# Altium footprint library SparkFun-Connectors.PCBLIB: 409 footprints (part 25 of 26)
Each footprint in its own frame and in the unit in brackets; x right, y up, seen from the top. Pads: shape width x height; smd on the part's side, far side on the other; paste and mask are expansions set on the pad; w line width, h text height; cw(c..) or ccw(c..) is an arc to the next point about the centre after c.
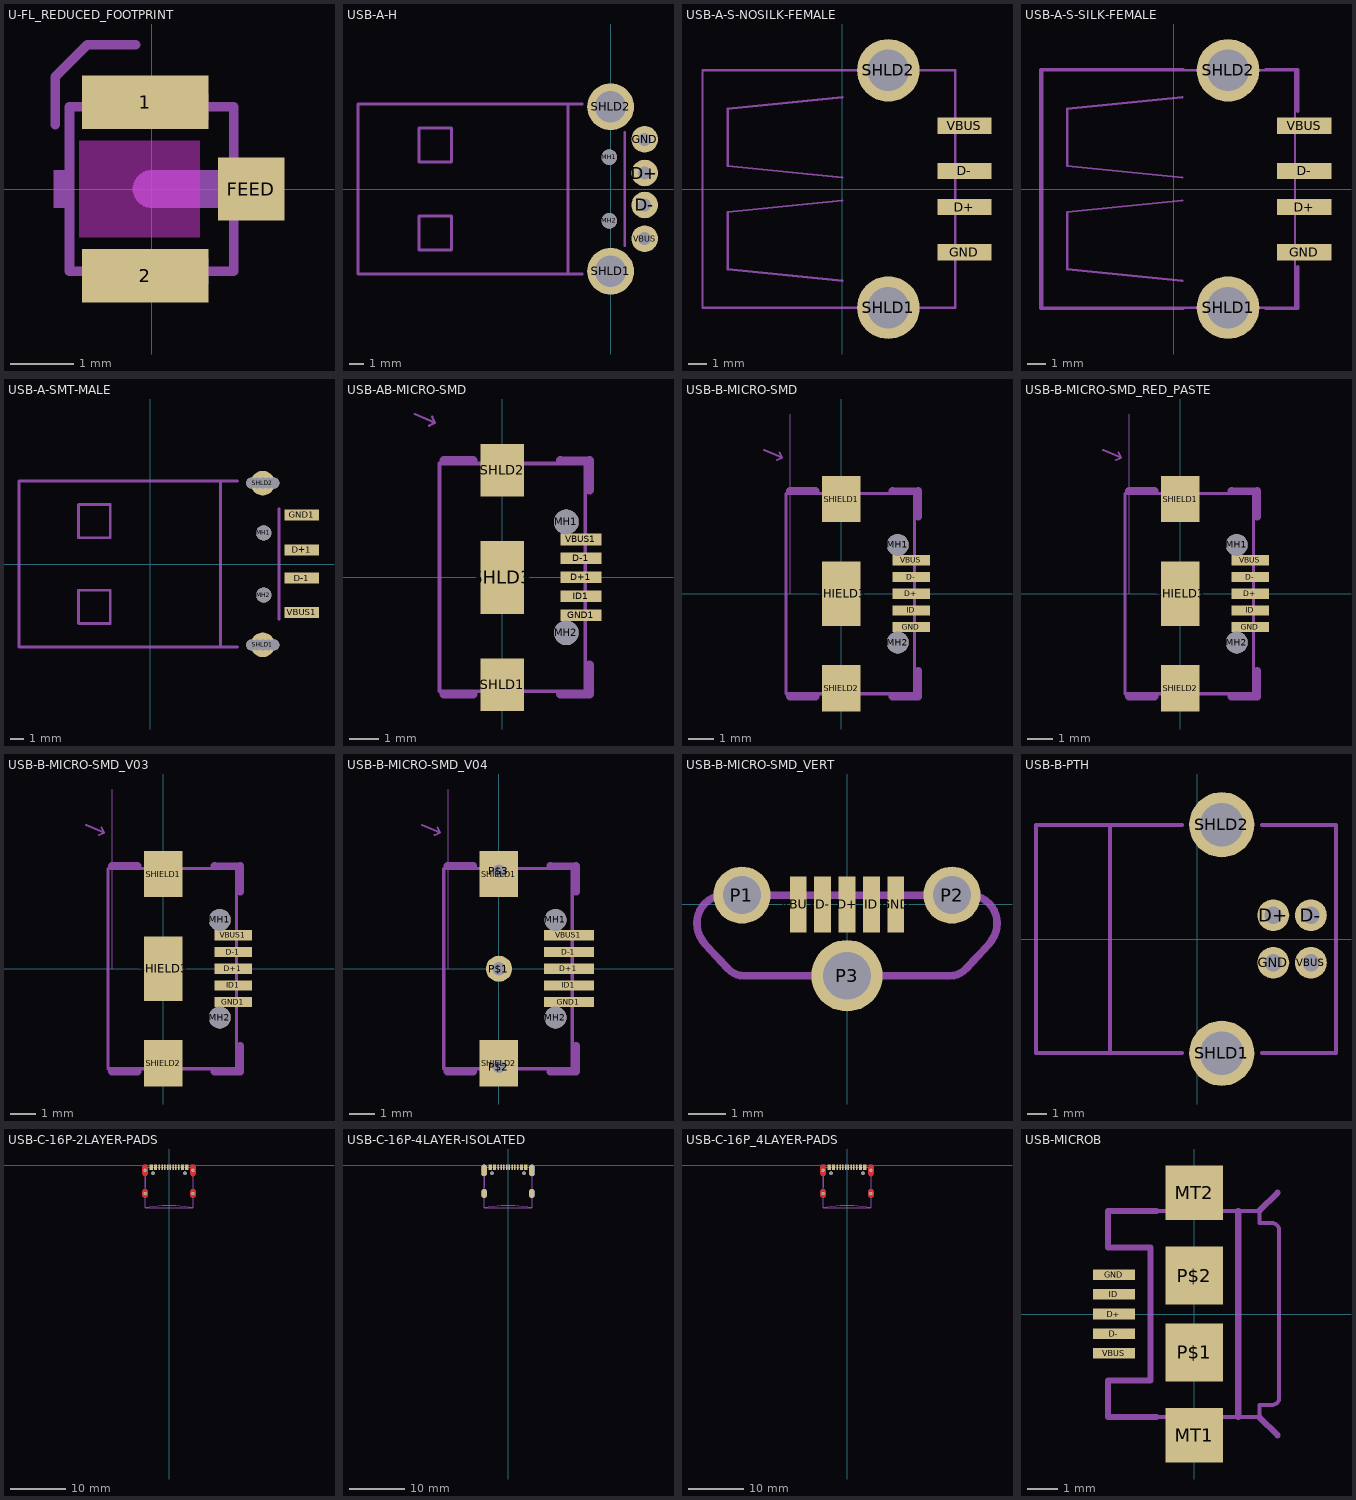
[diagram p24: the footprints below, top view; thin cyan lines are the x and y axes]

## U-FL_REDUCED_FOOTPRINT [mm]
pads (3):
  rect 2x0.85 smd paste+0: 1(-0.1,1.375) 2(-0.1,-1.375)
  rect 1.05x1 smd paste+0: FEED(1.575,0)
Top keep-out:
  region: -1.143,-0.762 -1.143,0.762 0.762,0.762 0.762,-0.762
Top Paste:
  region: 1.1,-0.4 1.1,0.4 1.95,0.4 1.95,-0.4
  region: -1.1,1.05 -1.1,1.75 0.9,1.75 0.9,1.05
  region: -1.1,-1.75 -1.1,-1.05 0.9,-1.05 0.9,-1.75
tDocu:
  circle w0.3: c0,0 r0.15
  region: -0.9,1.1 -0.9,1.5 0.9,1.5 0.9,1.1
  region: -0.9,-1.5 -0.9,-1.1 0.9,-1.1 0.9,-1.5
  region: 0,-0.3 0,0.3 1.55,0.3 1.55,-0.3
  region: -1.55,-0.3 -1.55,0.3 -1.3,0.3 -1.3,-0.3
  lines w0.152: -1.3,-1.3 1.3,-1.3 1.3,1.3 -1.3,1.3 -1.3,-1.3
tPlace:
  lines w0.152: -1.524,1.016 -1.524,1.778 -1.016,2.286 -0.254,2.286

## USB-A-H [mil]
pads (8):
  round 74 hole 36: D+(94.49,44.37) D-(94.49,-44.37) GND(94.49,137.8) VBUS(94.49,-137.8)
  round 43.31 hole 43.31 unplated: MH1(-3.94,88.58) MH2(-3.94,-88.58)
  round 129.91 hole 86.61: SHLD1(0,-228.35) SHLD2(0,228.35)
tDocu:
  lines w8: -118.11,-236.22 -700.79,-236.22 -700.79,236.22 -118.11,236.22 ; -531.5,-169.29 -531.5,-74.8 -440.94,-74.8 -440.94,-169.29 -531.5,-169.29 ; -531.5,74.8 -531.5,169.29 -440.94,169.29 -440.94,74.8 -531.5,74.8
  text "PCB Edge" at -153.54,-173.23 h77.5
tPlace:
  lines w8: -78.74,-236.22 -118.11,-236.22 -118.11,236.22 -78.74,236.22 ; 39.37,-157.48 39.37,157.48

## USB-A-S-NOSILK-FEMALE [mil]
pads (6):
  rect 118.11x35.43 smd: D+(265.83,-39.37) D-(265.83,39.37) GND(265.83,-137.8) VBUS(265.83,137.8)
  round 136.5 hole 91: SHLD1(100,-258.5) SHLD2(100,258.5)
tDocu:
  lines w5: -305,-258.5 245.5,-258.5 ; -305,-255 -305,255 ; -305,258.5 245.5,258.5 ; 0,-200 -250,-175 -250,-50 0,-25 ; 0,25 -250,50 -250,175 0,200 ; 246,-256 246,256

## USB-A-S-SILK-FEMALE [mil]
pads (6):
  rect 118.11x35.43 smd: D+(283.94,-39.37) D-(283.94,39.37) GND(283.94,-137.8) VBUS(283.94,137.8)
  round 136.5 hole 91: SHLD1(118.11,-258.5) SHLD2(118.11,258.5)
tDocu:
  lines w5: -286.89,-258.5 263.61,-258.5 ; -286.89,-255 -286.89,255 ; -286.89,258.5 263.61,258.5 ; 18.11,-200 -231.89,-175 -231.89,-50 18.11,-25 ; 18.11,25 -231.89,50 -231.89,175 18.11,200 ; 264.11,-256 264.11,256
tPlace:
  lines w8: 20,-260 -290,-260 -290,260 20,260 ; 200,-260 270,-260 270,-170 ; 200,260 270,260 270,170

## USB-A-SMT-MALE [mil]
pads (16):
  rect 98.43x31.5 smd: D+1(431.1,40.43) D-1(431.1,-40.43) GND1(431.1,139.8) VBUS1(431.1,-137.8)
  round 43.31 hole 43.31 unplated: MH1(322.83,88.58) MH2(322.83,-88.58)
  round 31.5 hole 31.5 unplated: MH3(335.83,-230.32) MH4(351.57,-230.32) MH5(304.33,-230.32) MH6(288.58,-230.32) MH7(335.83,230.32) MH8(351.57,230.32) MH9(304.33,230.32) MH10(288.58,230.32)
  round 70 hole 31.5: SHLD1(320.08,-230.32) SHLD2(320.08,230.32)
tDocu:
  lines w8: 200,-236.22 -374.02,-236.22 -374.02,236.22 200,236.22 ; -204.72,-169.29 -204.72,-74.8 -114.17,-74.8 -114.17,-169.29 -204.72,-169.29 ; -204.72,74.8 -204.72,169.29 -114.17,169.29 -114.17,74.8 -204.72,74.8
  text "PCB Edge" at 173.23,-173.23 h77.5
tValues:
  text ">VALUES" at -106.3,-257.09 h20.4
tPlace:
  lines w8: 248.03,-236.22 200,-236.22 200,236.22 248.03,236.22 ; 366.14,-157.48 366.14,157.48

## USB-AB-MICRO-SMD [mm]
pads (10):
  rect 1.4x0.4 smd: D+1(2.7,0) D-1(2.7,0.65) GND1(2.7,-1.3) ID1(2.7,-0.65) VBUS1(2.7,1.3)
  round 0.85 hole 0.85 unplated: MH1(2.2,1.9) MH2(2.2,-1.9)
  rect 1.5x1.8 smd: SHLD1(0,-3.68) SHLD2(0,3.68)
  rect 1.5x2.5 smd: SHLD3(0,0)
Top Paste:
  region: -0.75,2.784 -0.75,4.584 0.75,4.584 0.75,2.784
  region: -0.35,-0.75 -0.35,0.75 0.35,0.75 0.35,-0.75
  region: -0.75,-4.584 -0.75,-2.784 0.75,-2.784 0.75,-4.584
Top Solder:
  region: -0.85,2.684 -0.85,4.684 0.85,4.684 0.85,2.684
  region: -0.85,-4.684 -0.85,-2.684 0.85,-2.684 0.85,-4.684
  region: -0.85,-1.35 -0.85,1.35 0.85,1.35 0.85,-1.35
tDocu:
  lines w0.08: -3,5.6 -2.3,5.3 ; -2.5,5.2 -2.3,5.3 ; -2.4,5.5 -2.3,5.3
  text "PCB Front" at -4.66,5.96 h0.47
tPlace:
  lines w0.305: -2,-4 -1,-4 ; -2,4 -1,4 ; 2,-4 3,-4 3,-3 ; 2,4 2,3.993 2.982,3.993 ; 3,3 3,4
Reference:
  lines w0.127: -2.15,-3.9 -2.15,3.9 2.85,3.9 2.85,-3.9 -2.15,-3.9

## USB-B-MICRO-SMD [mm]
pads (10):
  rect 1.45x0.4 smd: D+(2.725,0) D-(2.725,0.65) GND(2.725,-1.3) ID(2.725,-0.65) VBUS(2.725,1.3)
  round 0.85 hole 0.85 unplated: MH1(2.2,1.9) MH2(2.2,-1.9)
  rect 1.5x1.8 smd paste+0 mask+0: SHIELD1(0,3.685) SHIELD2(0,-3.685)
  rect 1.5x2.5 smd paste+0 mask+0: SHIELD3(0,0)
Top Paste:
  region: -0.75,2.784 -0.75,4.584 0.75,4.584 0.75,2.784
  region: -0.35,-0.75 -0.35,0.75 0.35,0.75 0.35,-0.75
  region: -0.75,-4.584 -0.75,-2.784 0.75,-2.784 0.75,-4.584
Top Solder:
  region: -0.85,2.684 -0.85,4.684 0.85,4.684 0.85,2.684
  region: -0.85,-4.684 -0.85,-2.684 0.85,-2.684 0.85,-4.684
  region: -0.85,-1.35 -0.85,1.35 0.85,1.35 0.85,-1.35
tDocu:
  lines w0: -2,0 -2,7
  lines w0.08: -3,5.6 -2.3,5.3 ; -2.5,5.2 -2.3,5.3 ; -2.4,5.5 -2.3,5.3
  text "PCB Front" at -4.66,5.96 h0.47
tPlace:
  lines w0.305: -2,-4 -1,-4 ; -2,4 -1,4 ; 2,-4 3,-4 3,-3 ; 2,4 2,3.993 2.982,3.993 ; 3,3 3,4
Reference:
  lines w0.127: -2.15,-3.9 -2.15,3.9 2.85,3.9 2.85,-3.9 -2.15,-3.9

## USB-B-MICRO-SMD_RED_PASTE [mm]
pads (10):
  rect 1.45x0.4 smd paste+0: D+(2.725,0) D-(2.725,0.65) ID(2.725,-0.65)
  rect 1.45x0.4 smd: GND(2.725,-1.3) VBUS(2.725,1.3)
  round 0.85 hole 0.85 unplated: MH1(2.2,1.9) MH2(2.2,-1.9)
  rect 1.5x1.8 smd paste+0 mask+0: SHIELD1(0,3.685) SHIELD2(0,-3.685)
  rect 1.5x2.5 smd paste+0 mask+0: SHIELD3(0,0)
Top Paste:
  region: -0.75,2.784 -0.75,4.584 0.75,4.584 0.75,2.784
  region: -0.35,-0.75 -0.35,0.75 0.35,0.75 0.35,-0.75
  region: -0.75,-4.584 -0.75,-2.784 0.75,-2.784 0.75,-4.584
  region: 2.1,0.5 2.1,0.8 3.35,0.8 3.35,0.5
  region: 2.1,-0.15 2.1,0.15 3.35,0.15 3.35,-0.15
  region: 2.1,-0.8 2.1,-0.5 3.35,-0.5 3.35,-0.8
Top Solder:
  region: -0.85,2.684 -0.85,4.684 0.85,4.684 0.85,2.684
  region: -0.85,-4.684 -0.85,-2.684 0.85,-2.684 0.85,-4.684
  region: -0.85,-1.35 -0.85,1.35 0.85,1.35 0.85,-1.35
tDocu:
  lines w0: -2,0 -2,7
  lines w0.08: -3,5.6 -2.3,5.3 ; -2.5,5.2 -2.3,5.3 ; -2.4,5.5 -2.3,5.3
  text "PCB Front" at -4.66,5.96 h0.47
tPlace:
  lines w0.305: -2,-4 -1,-4 ; -2,4 -1,4 ; 2,-4 3,-4 3,-3 ; 2,4 2,3.993 2.982,3.993 ; 3,3 3,4
Reference:
  lines w0.127: -2.15,-3.9 -2.15,3.9 2.85,3.9 2.85,-3.9 -2.15,-3.9

## USB-B-MICRO-SMD_V03 [mm]
pads (10):
  rect 1.45x0.4 smd: D+1(2.725,0) D-1(2.725,0.65) GND1(2.725,-1.3) ID1(2.725,-0.65) VBUS1(2.725,1.3)
  round 0.85 hole 0.85 unplated: MH1(2.2,1.9) MH2(2.2,-1.9)
  rect 1.5x1.8 smd paste+0 mask+0: SHIELD1(0,3.685) SHIELD2(0,-3.685)
  rect 1.5x2.5 smd paste+0 mask+0: SHIELD3(0,0)
Top Paste:
  region: -0.75,2.784 -0.75,4.584 0.75,4.584 0.75,2.784
  region: -0.35,-0.75 -0.35,0.75 0.35,0.75 0.35,-0.75
  region: -0.75,-4.584 -0.75,-2.784 0.75,-2.784 0.75,-4.584
Top Solder:
  region: -0.85,2.684 -0.85,4.684 0.85,4.684 0.85,2.684
  region: -0.85,-4.684 -0.85,-2.684 0.85,-2.684 0.85,-4.684
  region: -0.85,-1.35 -0.85,1.35 0.85,1.35 0.85,-1.35
tDocu:
  lines w0: -2,0 -2,7
  lines w0.08: -3,5.6 -2.3,5.3 ; -2.5,5.2 -2.3,5.3 ; -2.4,5.5 -2.3,5.3
  text "PCB Front" at -4.66,5.96 h0.47
tPlace:
  lines w0.305: -2,-4 -1,-4 ; -2,4 -1,4 ; 2,-4 3,-4 3,-3 ; 2,4 2,3.993 2.982,3.993 ; 3,3 3,4
Reference:
  lines w0.127: -2.15,-3.9 -2.15,3.9 2.85,3.9 2.85,-3.9 -2.15,-3.9

## USB-B-MICRO-SMD_V04 [mil]
pads (12):
  rect 77.09x15.75 smd: D+1(107.28,0) D-1(107.28,25.59) GND1(107.28,-51.18) ID1(107.28,-25.59) VBUS1(107.28,51.18)
  round 33.46 hole 33.46 unplated: MH1(86.61,74.8) MH2(86.61,-74.8)
  round 40 hole 20: P$1(0,0) P$2(0,-150) P$3(0,150)
  rect 59.06x70.87 smd paste+0 mask+0: SHIELD1(0,145.08) SHIELD2(0,-145.08)
Top Paste:
  region: -29.53,109.61 -29.53,180.47 29.53,180.47 29.53,109.61
  region: -23.78,-39.53 -23.78,39.53 23.78,39.53 23.78,-39.53
  region: -29.53,-180.47 -29.53,-109.61 29.53,-109.61 29.53,-180.47
Top Solder:
  region: -33.46,105.67 -33.46,184.41 33.46,184.41 33.46,105.67
  region: -33.46,-184.41 -33.46,-105.67 33.46,-105.67 33.46,-184.41
  region: -33.46,-53.15 -33.46,53.15 33.46,53.15 33.46,-53.15
tDocu:
  lines w0: -78.74,0 -78.74,275.59
  lines w3.15: -118.11,220.47 -90.55,208.66 ; -98.43,204.72 -90.55,208.66 ; -94.49,216.54 -90.55,208.66
  text "PCB Front" at -183.46,234.65 h18.6
tPlace:
  lines w12: -78.74,-157.48 -39.37,-157.48 ; -78.74,157.48 -39.37,157.48 ; 78.74,-157.48 118.11,-157.48 118.11,-118.11 ; 78.74,157.48 78.74,157.2 117.4,157.2 ; 118.11,118.11 118.11,157.48
Reference:
  lines w5: -84.65,-153.54 -84.65,153.54 112.2,153.54 112.2,-153.54 -84.65,-153.54

## USB-B-MICRO-SMD_VERT [mil]
pads (8):
  rect 17.72x59.06 smd paste+0: D+(0,0) D-(-25.59,0) GND(51.18,0) ID(25.59,0) VBUS(-51.18,0)
  round 60 hole 40: P1(-110.24,9.84) P2(110.24,9.84)
  round 75 hole 50: P3(0,-74.8)
Top Paste:
  region: -56.3,-25.59 -56.3,25.59 -46.06,25.59 -46.06,-25.59
  region: -30.71,-25.59 -30.71,25.59 -20.47,25.59 -20.47,-25.59
  region: -5.12,-25.59 -5.12,25.59 5.12,25.59 5.12,-25.59
  region: 20.47,-25.59 20.47,25.59 30.71,25.59 30.71,-25.59
  region: 46.06,-25.59 46.06,25.59 56.3,25.59 56.3,-25.59
tPlace:
  lines w5: -157.48,-19.56 -157.48,-19.42 ; 157.48,-19.56 157.48,-19.42
  lines w8: -157.48,-19.56 ccw(c-124.62,-19.56) -148.68,-41.94 -124.9,-67.5 ccw(c-108.14,-51.91) -108.14,-74.8 108.14,-74.8 ccw(c108.14,-51.91) 124.9,-67.5 148.68,-41.94 ccw(c124.62,-19.56) 157.48,-19.56 ; -157.48,-19.42 cw(c-128.22,-19.42) -128.22,9.84 128.22,9.84 cw(c128.22,-19.42) 157.48,-19.42

## USB-B-PTH [mil]
pads (6):
  round 66 hole 36: D+(157.48,49.21) D-(235.48,49.21) GND(157.48,-49.21) VBUS(235.48,-49.21)
  round 135 hole 90: SHLD1(50.48,-237) SHLD2(50.48,237)
tDocu:
  lines w8: -334.65,-236.22 -181.1,-236.22 -181.1,236.22 -334.65,236.22 -334.65,-236.22
tPlace:
  lines w8: -181.1,-236.22 -31.5,-236.22 ; -181.1,236.22 -31.5,236.22 ; 133.86,-236.22 287.4,-236.22 287.4,236.22 133.86,236.22

## USB-C-16P-2LAYER-PADS [mm]
pads (18):
  rect 0.3x1 smd: A5(-1.25,-0.34) A6(-0.25,-0.34) A7(0.25,-0.34) A8(1.25,-0.34) B5(1.75,-0.34) B6(0.75,-0.34) B7(-0.75,-0.34) B8(-1.75,-0.34)
  rect 0.6x1 smd: GND(-3.225,-0.34) GND2(3.225,-0.34) VBUS1(-2.45,-0.34) VBUS2(2.45,-0.34)
  round 0.65 hole 0.65 unplated: MH1(-2.89,-1.445) MH2(2.89,-1.445)
  round 0.6 hole 0.4: SHLD1(-4.318,-0.915) SHLD2(4.318,-0.915) SHLD3(-4.318,-5.095) SHLD4(4.318,-5.095)
Top:
  region: -3.818,-0.365 -3.818,-1.465 -3.818,-1.565 -3.894,-1.748 -4.035,-1.889 -4.219,-1.965 -4.318,-1.965 -4.417,-1.965 -4.601,-1.889 -4.742,-1.748 -4.818,-1.565 -4.818,-1.465 -4.818,-0.365 -4.818,-0.266 -4.742,-0.082 -4.601,0.059 -4.417,0.135 -4.318,0.135 -4.219,0.135 -4.035,0.059 -3.894,-0.082 -3.818,-0.266 -3.818,-0.365
  region: 4.818,-0.365 4.818,-1.465 4.818,-1.565 4.742,-1.748 4.601,-1.889 4.417,-1.965 4.318,-1.965 4.219,-1.965 4.035,-1.889 3.894,-1.748 3.818,-1.565 3.818,-1.465 3.818,-0.365 3.818,-0.266 3.894,-0.082 4.035,0.059 4.219,0.135 4.318,0.135 4.417,0.135 4.601,0.059 4.742,-0.082 4.818,-0.266 4.818,-0.365
  region: -4.318,-5.895 -4.417,-5.895 -4.601,-5.819 -4.742,-5.678 -4.818,-5.494 -4.818,-5.395 -4.818,-4.795 -4.818,-4.696 -4.742,-4.512 -4.601,-4.371 -4.417,-4.295 -4.318,-4.295 -4.219,-4.295 -4.035,-4.371 -3.894,-4.512 -3.818,-4.696 -3.818,-4.795 -3.818,-5.395 -3.818,-5.494 -3.894,-5.678 -4.035,-5.819 -4.219,-5.895 -4.318,-5.895
  region: 4.818,-4.795 4.818,-5.395 4.818,-5.494 4.742,-5.678 4.601,-5.819 4.417,-5.895 4.318,-5.895 4.219,-5.895 4.035,-5.819 3.894,-5.678 3.818,-5.494 3.818,-5.395 3.818,-4.795 3.818,-4.696 3.894,-4.512 4.035,-4.371 4.219,-4.295 4.318,-4.295 4.417,-4.295 4.601,-4.371 4.742,-4.512 4.818,-4.696 4.818,-4.795
Bottom:
  region: -4.818,-0.365 -4.818,-1.465 -4.818,-1.565 -4.742,-1.748 -4.601,-1.889 -4.417,-1.965 -4.318,-1.965 -4.219,-1.965 -4.035,-1.889 -3.894,-1.748 -3.818,-1.565 -3.818,-1.465 -3.818,-0.365 -3.818,-0.266 -3.894,-0.082 -4.035,0.059 -4.219,0.135 -4.318,0.135 -4.417,0.135 -4.601,0.059 -4.742,-0.082 -4.818,-0.266 -4.818,-0.365
  region: 3.818,-0.365 3.818,-1.465 3.818,-1.565 3.894,-1.748 4.035,-1.889 4.219,-1.965 4.318,-1.965 4.417,-1.965 4.601,-1.889 4.742,-1.748 4.818,-1.565 4.818,-1.465 4.818,-0.365 4.818,-0.266 4.742,-0.082 4.601,0.059 4.417,0.135 4.318,0.135 4.219,0.135 4.035,0.059 3.894,-0.082 3.818,-0.266 3.818,-0.365
  region: -4.818,-4.795 -4.818,-5.395 -4.818,-5.494 -4.742,-5.678 -4.601,-5.819 -4.417,-5.895 -4.318,-5.895 -4.219,-5.895 -4.035,-5.819 -3.894,-5.678 -3.818,-5.494 -3.818,-5.395 -3.818,-4.795 -3.818,-4.696 -3.894,-4.512 -4.035,-4.371 -4.219,-4.295 -4.318,-4.295 -4.417,-4.295 -4.601,-4.371 -4.742,-4.512 -4.818,-4.696 -4.818,-4.795
  region: 4.318,-5.895 4.417,-5.895 4.601,-5.819 4.742,-5.678 4.818,-5.494 4.818,-5.395 4.818,-4.795 4.818,-4.696 4.742,-4.512 4.601,-4.371 4.417,-4.295 4.318,-4.295 4.219,-4.295 4.035,-4.371 3.894,-4.512 3.818,-4.696 3.818,-4.795 3.818,-5.395 3.818,-5.494 3.894,-5.678 4.035,-5.819 4.219,-5.895 4.318,-5.895
Top Paste:
  region: -4.82,-1.52 -4.82,-0.32 -4.82,-0.227 -4.748,-0.054 -4.616,0.078 -4.443,0.15 -4.35,0.15 -4.251,0.156 -4.062,0.091 -3.913,-0.041 -3.826,-0.221 -3.82,-0.32 -3.82,-1.52 -3.83,-1.615 -3.921,-1.784 -4.07,-1.905 -4.255,-1.96 -4.35,-1.95 -4.44,-1.954 -4.608,-1.893 -4.74,-1.772 -4.816,-1.609 -4.82,-1.52
  region: 3.82,-1.57 3.82,-0.37 3.816,-0.271 3.885,-0.084 4.02,0.063 4.2,0.146 4.3,0.15 4.398,0.155 4.584,0.089 4.73,-0.043 4.815,-0.222 4.82,-0.32 4.82,-1.52 4.811,-1.614 4.722,-1.782 4.576,-1.903 4.394,-1.959 4.3,-1.95 4.214,-1.96 4.049,-1.913 3.914,-1.806 3.83,-1.656 3.82,-1.57
  region: 3.82,-5.45 3.82,-4.85 3.813,-4.747 3.879,-4.553 4.014,-4.398 4.198,-4.307 4.3,-4.3 4.401,-4.298 4.59,-4.372 4.737,-4.513 4.818,-4.699 4.82,-4.8 4.82,-5.4 4.823,-5.496 4.755,-5.677 4.622,-5.818 4.446,-5.897 4.35,-5.9 4.253,-5.908 4.066,-5.848 3.917,-5.722 3.828,-5.548 3.82,-5.45
  region: -4.82,-5.4 -4.82,-4.8 -4.818,-4.699 -4.737,-4.513 -4.59,-4.372 -4.401,-4.298 -4.3,-4.3 -4.202,-4.302 -4.024,-4.38 -3.889,-4.521 -3.818,-4.703 -3.82,-4.8 -3.82,-5.4 -3.818,-5.497 -3.889,-5.679 -4.024,-5.82 -4.203,-5.898 -4.3,-5.9 -4.401,-5.902 -4.59,-5.828 -4.737,-5.687 -4.818,-5.501 -4.82,-5.4
Top Solder:
  region: -4.92,-1.52 -4.92,-0.32 -4.916,-0.205 -4.819,0.004 -4.651,0.16 -4.435,0.239 -4.32,0.235 -4.205,0.239 -3.989,0.16 -3.821,0.004 -3.725,-0.205 -3.72,-0.32 -3.72,-1.52 -3.726,-1.634 -3.823,-1.84 -3.992,-1.993 -4.206,-2.07 -4.32,-2.065 -4.434,-2.07 -4.649,-1.993 -4.817,-1.84 -4.915,-1.634 -4.92,-1.52
  region: 3.72,-1.52 3.72,-0.32 3.725,-0.205 3.821,0.004 3.989,0.16 4.205,0.239 4.32,0.235 4.435,0.239 4.651,0.16 4.819,0.004 4.916,-0.205 4.92,-0.32 4.92,-1.52 4.915,-1.634 4.817,-1.84 4.649,-1.993 4.434,-2.07 4.32,-2.065 4.206,-2.07 3.992,-1.993 3.823,-1.84 3.726,-1.634 3.72,-1.52
  region: 3.72,-5.4 3.72,-4.8 3.72,-4.68 3.81,-4.458 3.979,-4.288 4.2,-4.196 4.32,-4.195 4.44,-4.196 4.661,-4.288 4.83,-4.458 4.92,-4.68 4.92,-4.8 4.92,-5.4 4.919,-5.519 4.828,-5.738 4.659,-5.905 4.439,-5.995 4.32,-5.995 4.201,-5.995 3.981,-5.905 3.812,-5.738 3.721,-5.519 3.72,-5.4
  region: -4.92,-5.4 -4.92,-4.8 -4.92,-4.68 -4.83,-4.458 -4.661,-4.288 -4.44,-4.196 -4.32,-4.195 -4.2,-4.196 -3.979,-4.288 -3.81,-4.458 -3.72,-4.68 -3.72,-4.8 -3.72,-5.4 -3.721,-5.519 -3.812,-5.738 -3.981,-5.905 -4.201,-5.995 -4.32,-5.995 -4.439,-5.995 -4.659,-5.905 -4.828,-5.738 -4.919,-5.519 -4.92,-5.4
Milling:
  lines w0.6: -4.318,-5.4 -4.318,-4.78 ; -4.318,-1.465 -4.318,-0.365 ; 4.318,-5.4 4.318,-4.78 ; 4.318,-1.465 4.318,-0.365
tDocu:
  region: 3.025,-0.595 3.025,-0.095 3.425,-0.095 3.425,-0.595
  region: 2.25,-0.595 2.25,-0.095 2.65,-0.095 2.65,-0.595
  region: 1.65,-0.6 1.65,-0.1 1.85,-0.1 1.85,-0.6
  region: 1.15,-0.6 1.15,-0.1 1.35,-0.1 1.35,-0.6
  region: 0.65,-0.595 0.65,-0.095 0.85,-0.095 0.85,-0.595
  region: 0.15,-0.595 0.15,-0.095 0.35,-0.095 0.35,-0.595
  region: -0.35,-0.595 -0.35,-0.095 -0.15,-0.095 -0.15,-0.595
  region: -0.85,-0.595 -0.85,-0.095 -0.65,-0.095 -0.65,-0.595
  region: -1.35,-0.595 -1.35,-0.095 -1.15,-0.095 -1.15,-0.595
  region: -1.85,-0.595 -1.85,-0.095 -1.65,-0.095 -1.65,-0.595
  region: -2.65,-0.595 -2.65,-0.095 -2.25,-0.095 -2.25,-0.595
  region: -3.425,-0.595 -3.425,-0.095 -3.025,-0.095 -3.025,-0.595
  lines w0.01: -4.32,-5.895 -4.32,-4.295 ; -4.32,-1.965 -4.32,-0.345 ; 4.32,-5.895 4.32,-4.295 ; 4.32,-1.965 4.32,-0.345
  lines w0.152: -4.32,-7.7 cw(c0,-30.692) 4.32,-7.7 ; -4.32,-7.695 4.32,-7.695 4.32,-0.345 -4.32,-0.345 -4.32,-7.695
tPlace:
  lines w0.203: -4.32,-4 -4.32,-2.2 ; 4.32,-4 4.32,-2.2

## USB-C-16P-4LAYER-ISOLATED [mm]
pads (22):
  rect 0.3x1 smd: A5(-1.25,-0.34) A6(-0.25,-0.34) A7(0.25,-0.34) A8(1.25,-0.34) B5(1.75,-0.34) B6(0.75,-0.34) B7(-0.75,-0.34) B8(-1.75,-0.34)
  rect 0.6x1 smd: GND(-3.225,-0.34) GND2(3.225,-0.34) VBUS1(-2.45,-0.34) VBUS2(2.45,-0.34)
  round 0.65 hole 0.65 unplated: MH1(-2.89,-1.445) MH2(2.89,-1.445)
  rrect100% 1x2.1 smd paste+0 mask+0: SHLD1(-4.32,-0.915) SHLD2(4.32,-0.915)
  rrect100% 1x2.1 smd far side paste+0 mask+0: SHLD3(-4.32,-0.915) SHLD4(4.32,-0.915)
  rrect100% 1x1.6 smd paste+0 mask+0: SHLD5(-4.32,-5.095) SHLD8(4.32,-5.095)
  rrect100% 1x1.6 smd far side paste+0 mask+0: SHLD6(-4.32,-5.095) SHLD7(4.32,-5.095)
Route2:
  pour cut-out: -4.8,0.1 -3.8,0.1 -3.8,-2 -4.8,-2
  pour cut-out: -4.8,-4.3 -3.8,-4.3 -3.8,-5.9 -4.8,-5.9
  pour cut-out: 3.8,0.1 4.8,0.1 4.8,-1.9 4.8,-2 3.8,-2
  pour cut-out: 3.8,-4.3 4.8,-4.3 4.8,-5.9 3.8,-5.9
Route15:
  pour cut-out: -4.8,0.1 -3.8,0.1 -3.8,-2 -4.8,-2
  pour cut-out: -4.8,-4.3 -3.8,-4.3 -3.8,-5.9 -4.8,-5.9
  pour cut-out: 3.8,0.1 4.8,0.1 4.8,-2 3.8,-2
  pour cut-out: 3.8,-4.3 4.8,-4.3 4.8,-5.9 3.8,-5.9
Top Paste:
  region: -4.82,-1.52 -4.82,-0.32 -4.82,-0.227 -4.748,-0.054 -4.616,0.078 -4.443,0.15 -4.35,0.15 -4.251,0.156 -4.062,0.091 -3.913,-0.041 -3.826,-0.221 -3.82,-0.32 -3.82,-1.52 -3.83,-1.615 -3.921,-1.784 -4.07,-1.905 -4.255,-1.96 -4.35,-1.95 -4.44,-1.954 -4.608,-1.893 -4.74,-1.772 -4.816,-1.609 -4.82,-1.52
  region: 3.82,-1.57 3.82,-0.37 3.816,-0.271 3.885,-0.084 4.02,0.063 4.2,0.146 4.3,0.15 4.398,0.155 4.584,0.089 4.73,-0.043 4.815,-0.222 4.82,-0.32 4.82,-1.52 4.811,-1.614 4.722,-1.782 4.576,-1.903 4.394,-1.959 4.3,-1.95 4.214,-1.96 4.049,-1.913 3.914,-1.806 3.83,-1.656 3.82,-1.57
  region: 3.82,-5.45 3.82,-4.85 3.813,-4.747 3.879,-4.553 4.014,-4.398 4.198,-4.307 4.3,-4.3 4.401,-4.298 4.59,-4.372 4.737,-4.513 4.818,-4.699 4.82,-4.8 4.82,-5.4 4.823,-5.496 4.755,-5.677 4.622,-5.818 4.446,-5.897 4.35,-5.9 4.253,-5.908 4.066,-5.848 3.917,-5.722 3.828,-5.548 3.82,-5.45
  region: -4.82,-5.4 -4.82,-4.8 -4.818,-4.699 -4.737,-4.513 -4.59,-4.372 -4.401,-4.298 -4.3,-4.3 -4.202,-4.302 -4.024,-4.38 -3.889,-4.521 -3.818,-4.703 -3.82,-4.8 -3.82,-5.4 -3.818,-5.497 -3.889,-5.679 -4.024,-5.82 -4.203,-5.898 -4.3,-5.9 -4.401,-5.902 -4.59,-5.828 -4.737,-5.687 -4.818,-5.501 -4.82,-5.4
Top Solder:
  region: -4.92,-1.52 -4.92,-0.32 -4.916,-0.205 -4.819,0.004 -4.651,0.16 -4.435,0.239 -4.32,0.235 -4.205,0.239 -3.989,0.16 -3.821,0.004 -3.725,-0.205 -3.72,-0.32 -3.72,-1.52 -3.726,-1.634 -3.823,-1.84 -3.992,-1.993 -4.206,-2.07 -4.32,-2.065 -4.434,-2.07 -4.649,-1.993 -4.817,-1.84 -4.915,-1.634 -4.92,-1.52
  region: 3.72,-1.52 3.72,-0.32 3.725,-0.205 3.821,0.004 3.989,0.16 4.205,0.239 4.32,0.235 4.435,0.239 4.651,0.16 4.819,0.004 4.916,-0.205 4.92,-0.32 4.92,-1.52 4.915,-1.634 4.817,-1.84 4.649,-1.993 4.434,-2.07 4.32,-2.065 4.206,-2.07 3.992,-1.993 3.823,-1.84 3.726,-1.634 3.72,-1.52
  region: 3.72,-5.4 3.72,-4.8 3.72,-4.68 3.81,-4.458 3.979,-4.288 4.2,-4.196 4.32,-4.195 4.44,-4.196 4.661,-4.288 4.83,-4.458 4.92,-4.68 4.92,-4.8 4.92,-5.4 4.919,-5.519 4.828,-5.738 4.659,-5.905 4.439,-5.995 4.32,-5.995 4.201,-5.995 3.981,-5.905 3.812,-5.738 3.721,-5.519 3.72,-5.4
  region: -4.92,-5.4 -4.92,-4.8 -4.92,-4.68 -4.83,-4.458 -4.661,-4.288 -4.44,-4.196 -4.32,-4.195 -4.2,-4.196 -3.979,-4.288 -3.81,-4.458 -3.72,-4.68 -3.72,-4.8 -3.72,-5.4 -3.721,-5.519 -3.812,-5.738 -3.981,-5.905 -4.201,-5.995 -4.32,-5.995 -4.439,-5.995 -4.659,-5.905 -4.828,-5.738 -4.919,-5.519 -4.92,-5.4
Milling:
  lines w0.01: -4.62,-5.4 -4.62,-4.78 cw(c-4.32,-4.78) -4.02,-4.78 -4.02,-5.4 cw(c-4.32,-5.4) -4.62,-5.4 ; -4.62,-1.465 -4.62,-0.365 cw(c-4.32,-0.365) -4.02,-0.365 -4.02,-1.465 cw(c-4.32,-1.465) -4.62,-1.465 ; 4.02,-5.4 4.02,-4.78 cw(c4.32,-4.78) 4.62,-4.78 4.62,-5.4 cw(c4.32,-5.4) 4.02,-5.4 ; 4.02,-1.465 4.02,-0.365 cw(c4.32,-0.365) 4.62,-0.365 4.62,-1.465 cw(c4.32,-1.465) 4.02,-1.465
tDocu:
  region: 3.025,-0.595 3.025,-0.095 3.425,-0.095 3.425,-0.595
  region: 2.25,-0.595 2.25,-0.095 2.65,-0.095 2.65,-0.595
  region: 1.65,-0.6 1.65,-0.1 1.85,-0.1 1.85,-0.6
  region: 1.15,-0.6 1.15,-0.1 1.35,-0.1 1.35,-0.6
  region: 0.65,-0.595 0.65,-0.095 0.85,-0.095 0.85,-0.595
  region: 0.15,-0.595 0.15,-0.095 0.35,-0.095 0.35,-0.595
  region: -0.35,-0.595 -0.35,-0.095 -0.15,-0.095 -0.15,-0.595
  region: -0.85,-0.595 -0.85,-0.095 -0.65,-0.095 -0.65,-0.595
  region: -1.35,-0.595 -1.35,-0.095 -1.15,-0.095 -1.15,-0.595
  region: -1.85,-0.595 -1.85,-0.095 -1.65,-0.095 -1.65,-0.595
  region: -2.65,-0.595 -2.65,-0.095 -2.25,-0.095 -2.25,-0.595
  region: -3.425,-0.595 -3.425,-0.095 -3.025,-0.095 -3.025,-0.595
  lines w0.01: -4.82,-5.395 -3.82,-5.395 ; -4.82,-5.095 -3.82,-5.095 ; -4.82,-4.795 -3.82,-4.795 ; -4.82,-1.515 -3.82,-1.515 ; -4.82,-0.915 -3.82,-0.915 ; -4.82,-0.315 -3.82,-0.315 ; -4.32,-5.895 -4.32,-4.295 ; -4.32,-1.965 -4.32,-0.345 -4.32,0.135 ; 3.82,-5.395 4.82,-5.395 ; 3.82,-5.095 4.82,-5.095 ; 3.82,-4.795 4.82,-4.795 ; 3.82,-1.515 4.82,-1.515 ; 3.82,-0.915 4.82,-0.915 ; 3.82,-0.315 4.82,-0.315 ; 4.32,-5.895 4.32,-4.295 ; 4.32,-1.965 4.32,-0.345 4.32,0.135
  lines w0.152: -4.32,-7.7 cw(c0,-30.692) 4.32,-7.7 ; -4.32,-7.695 4.32,-7.695 4.32,-0.345 -4.32,-0.345 -4.32,-7.695
bDocu:
  lines w0.01: -4.62,-5.095 -4.02,-5.095 ; -4.62,-0.915 -4.02,-0.915 ; -4.32,-5.695 -4.32,-4.495 ; -4.32,-1.765 -4.32,-0.065 ; 4.02,-5.095 4.62,-5.095 ; 4.02,-0.915 4.62,-0.915 ; 4.32,-5.695 4.32,-4.495 ; 4.32,-1.765 4.32,-0.065
tPlace:
  lines w0.203: -4.32,-4 -4.32,-2.2 ; 4.32,-4 4.32,-2.2

## USB-C-16P_4LAYER-PADS [mm]
pads (18):
  rect 0.3x1 smd: A5(-1.25,-0.34) A6(-0.25,-0.34) A7(0.25,-0.34) A8(1.25,-0.34) B5(1.75,-0.34) B6(0.75,-0.34) B7(-0.75,-0.34) B8(-1.75,-0.34)
  rect 0.6x1 smd: GND(-3.225,-0.34) GND2(3.225,-0.34) VBUS1(-2.45,-0.34) VBUS2(2.45,-0.34)
  round 0.65 hole 0.65 unplated: MH1(-2.89,-1.445) MH2(2.89,-1.445)
  round 0.6 hole 0.4: SHLD1(-4.318,-0.915) SHLD2(4.318,-0.915) SHLD3(-4.318,-5.095) SHLD4(4.318,-5.095)
Top:
  region: -3.818,-0.365 -3.818,-1.465 -3.818,-1.565 -3.894,-1.748 -4.035,-1.889 -4.219,-1.965 -4.318,-1.965 -4.417,-1.965 -4.601,-1.889 -4.742,-1.748 -4.818,-1.565 -4.818,-1.465 -4.818,-0.365 -4.818,-0.266 -4.742,-0.082 -4.601,0.059 -4.417,0.135 -4.318,0.135 -4.219,0.135 -4.035,0.059 -3.894,-0.082 -3.818,-0.266 -3.818,-0.365
  region: 4.818,-0.365 4.818,-1.465 4.818,-1.565 4.742,-1.748 4.601,-1.889 4.417,-1.965 4.318,-1.965 4.219,-1.965 4.035,-1.889 3.894,-1.748 3.818,-1.565 3.818,-1.465 3.818,-0.365 3.818,-0.266 3.894,-0.082 4.035,0.059 4.219,0.135 4.318,0.135 4.417,0.135 4.601,0.059 4.742,-0.082 4.818,-0.266 4.818,-0.365
  region: -4.318,-5.895 -4.417,-5.895 -4.601,-5.819 -4.742,-5.678 -4.818,-5.494 -4.818,-5.395 -4.818,-4.795 -4.818,-4.696 -4.742,-4.512 -4.601,-4.371 -4.417,-4.295 -4.318,-4.295 -4.219,-4.295 -4.035,-4.371 -3.894,-4.512 -3.818,-4.696 -3.818,-4.795 -3.818,-5.395 -3.818,-5.494 -3.894,-5.678 -4.035,-5.819 -4.219,-5.895 -4.318,-5.895
  region: 4.818,-4.795 4.818,-5.395 4.818,-5.494 4.742,-5.678 4.601,-5.819 4.417,-5.895 4.318,-5.895 4.219,-5.895 4.035,-5.819 3.894,-5.678 3.818,-5.494 3.818,-5.395 3.818,-4.795 3.818,-4.696 3.894,-4.512 4.035,-4.371 4.219,-4.295 4.318,-4.295 4.417,-4.295 4.601,-4.371 4.742,-4.512 4.818,-4.696 4.818,-4.795
Route2:
  region: -4.018,-0.365 -4.018,-1.465 -4.018,-1.525 -4.064,-1.635 -4.148,-1.719 -4.258,-1.765 -4.318,-1.765 -4.378,-1.765 -4.488,-1.719 -4.572,-1.635 -4.618,-1.525 -4.618,-1.465 -4.618,-0.365 -4.618,-0.305 -4.572,-0.195 -4.488,-0.111 -4.378,-0.065 -4.318,-0.065 -4.258,-0.065 -4.148,-0.111 -4.064,-0.195 -4.018,-0.305 -4.018,-0.365
  region: 4.618,-0.365 4.618,-1.465 4.618,-1.525 4.572,-1.635 4.488,-1.719 4.378,-1.765 4.318,-1.765 4.258,-1.765 4.148,-1.719 4.064,-1.635 4.018,-1.525 4.018,-1.465 4.018,-0.365 4.018,-0.305 4.064,-0.195 4.148,-0.111 4.258,-0.065 4.318,-0.065 4.378,-0.065 4.488,-0.111 4.572,-0.195 4.618,-0.305 4.618,-0.365
  region: -4.618,-5.4 -4.618,-4.78 -4.618,-4.72 -4.572,-4.61 -4.488,-4.526 -4.378,-4.48 -4.318,-4.48 -4.258,-4.48 -4.148,-4.526 -4.064,-4.61 -4.018,-4.72 -4.018,-4.78 -4.018,-5.4 -4.018,-5.46 -4.064,-5.57 -4.148,-5.654 -4.258,-5.7 -4.318,-5.7 -4.378,-5.7 -4.488,-5.654 -4.572,-5.57 -4.618,-5.46 -4.618,-5.4
  region: 4.318,-5.7 4.258,-5.7 4.148,-5.654 4.064,-5.57 4.018,-5.46 4.018,-5.4 4.018,-4.78 4.018,-4.72 4.064,-4.61 4.148,-4.526 4.258,-4.48 4.318,-4.48 4.378,-4.48 4.488,-4.526 4.572,-4.61 4.618,-4.72 4.618,-4.78 4.618,-5.4 4.618,-5.46 4.572,-5.57 4.488,-5.654 4.378,-5.7 4.318,-5.7
Route15:
  region: -4.018,-0.365 -4.018,-1.465 -4.018,-1.525 -4.064,-1.635 -4.148,-1.719 -4.258,-1.765 -4.318,-1.765 -4.378,-1.765 -4.488,-1.719 -4.572,-1.635 -4.618,-1.525 -4.618,-1.465 -4.618,-0.365 -4.618,-0.305 -4.572,-0.195 -4.488,-0.111 -4.378,-0.065 -4.318,-0.065 -4.258,-0.065 -4.148,-0.111 -4.064,-0.195 -4.018,-0.305 -4.018,-0.365
  region: 4.618,-0.365 4.618,-1.465 4.618,-1.525 4.572,-1.635 4.488,-1.719 4.378,-1.765 4.318,-1.765 4.258,-1.765 4.148,-1.719 4.064,-1.635 4.018,-1.525 4.018,-1.465 4.018,-0.365 4.018,-0.305 4.064,-0.195 4.148,-0.111 4.258,-0.065 4.318,-0.065 4.378,-0.065 4.488,-0.111 4.572,-0.195 4.618,-0.305 4.618,-0.365
  region: -4.618,-5.4 -4.618,-4.78 -4.618,-4.72 -4.572,-4.61 -4.488,-4.526 -4.378,-4.48 -4.318,-4.48 -4.258,-4.48 -4.148,-4.526 -4.064,-4.61 -4.018,-4.72 -4.018,-4.78 -4.018,-5.4 -4.018,-5.46 -4.064,-5.57 -4.148,-5.654 -4.258,-5.7 -4.318,-5.7 -4.378,-5.7 -4.488,-5.654 -4.572,-5.57 -4.618,-5.46 -4.618,-5.4
  region: 4.318,-5.7 4.258,-5.7 4.148,-5.654 4.064,-5.57 4.018,-5.46 4.018,-5.4 4.018,-4.78 4.018,-4.72 4.064,-4.61 4.148,-4.526 4.258,-4.48 4.318,-4.48 4.378,-4.48 4.488,-4.526 4.572,-4.61 4.618,-4.72 4.618,-4.78 4.618,-5.4 4.618,-5.46 4.572,-5.57 4.488,-5.654 4.378,-5.7 4.318,-5.7
Bottom:
  region: -4.818,-0.365 -4.818,-1.465 -4.818,-1.565 -4.742,-1.748 -4.601,-1.889 -4.417,-1.965 -4.318,-1.965 -4.219,-1.965 -4.035,-1.889 -3.894,-1.748 -3.818,-1.565 -3.818,-1.465 -3.818,-0.365 -3.818,-0.266 -3.894,-0.082 -4.035,0.059 -4.219,0.135 -4.318,0.135 -4.417,0.135 -4.601,0.059 -4.742,-0.082 -4.818,-0.266 -4.818,-0.365
  region: 3.818,-0.365 3.818,-1.465 3.818,-1.565 3.894,-1.748 4.035,-1.889 4.219,-1.965 4.318,-1.965 4.417,-1.965 4.601,-1.889 4.742,-1.748 4.818,-1.565 4.818,-1.465 4.818,-0.365 4.818,-0.266 4.742,-0.082 4.601,0.059 4.417,0.135 4.318,0.135 4.219,0.135 4.035,0.059 3.894,-0.082 3.818,-0.266 3.818,-0.365
  region: -4.818,-4.795 -4.818,-5.395 -4.818,-5.494 -4.742,-5.678 -4.601,-5.819 -4.417,-5.895 -4.318,-5.895 -4.219,-5.895 -4.035,-5.819 -3.894,-5.678 -3.818,-5.494 -3.818,-5.395 -3.818,-4.795 -3.818,-4.696 -3.894,-4.512 -4.035,-4.371 -4.219,-4.295 -4.318,-4.295 -4.417,-4.295 -4.601,-4.371 -4.742,-4.512 -4.818,-4.696 -4.818,-4.795
  region: 4.318,-5.895 4.417,-5.895 4.601,-5.819 4.742,-5.678 4.818,-5.494 4.818,-5.395 4.818,-4.795 4.818,-4.696 4.742,-4.512 4.601,-4.371 4.417,-4.295 4.318,-4.295 4.219,-4.295 4.035,-4.371 3.894,-4.512 3.818,-4.696 3.818,-4.795 3.818,-5.395 3.818,-5.494 3.894,-5.678 4.035,-5.819 4.219,-5.895 4.318,-5.895
Top Paste:
  region: -4.82,-1.52 -4.82,-0.32 -4.82,-0.227 -4.748,-0.054 -4.616,0.078 -4.443,0.15 -4.35,0.15 -4.251,0.156 -4.062,0.091 -3.913,-0.041 -3.826,-0.221 -3.82,-0.32 -3.82,-1.52 -3.83,-1.615 -3.921,-1.784 -4.07,-1.905 -4.255,-1.96 -4.35,-1.95 -4.44,-1.954 -4.608,-1.893 -4.74,-1.772 -4.816,-1.609 -4.82,-1.52
  region: 3.82,-1.57 3.82,-0.37 3.816,-0.271 3.885,-0.084 4.02,0.063 4.2,0.146 4.3,0.15 4.398,0.155 4.584,0.089 4.73,-0.043 4.815,-0.222 4.82,-0.32 4.82,-1.52 4.811,-1.614 4.722,-1.782 4.576,-1.903 4.394,-1.959 4.3,-1.95 4.214,-1.96 4.049,-1.913 3.914,-1.806 3.83,-1.656 3.82,-1.57
  region: 3.82,-5.45 3.82,-4.85 3.813,-4.747 3.879,-4.553 4.014,-4.398 4.198,-4.307 4.3,-4.3 4.401,-4.298 4.59,-4.372 4.737,-4.513 4.818,-4.699 4.82,-4.8 4.82,-5.4 4.823,-5.496 4.755,-5.677 4.622,-5.818 4.446,-5.897 4.35,-5.9 4.253,-5.908 4.066,-5.848 3.917,-5.722 3.828,-5.548 3.82,-5.45
  region: -4.82,-5.4 -4.82,-4.8 -4.818,-4.699 -4.737,-4.513 -4.59,-4.372 -4.401,-4.298 -4.3,-4.3 -4.202,-4.302 -4.024,-4.38 -3.889,-4.521 -3.818,-4.703 -3.82,-4.8 -3.82,-5.4 -3.818,-5.497 -3.889,-5.679 -4.024,-5.82 -4.203,-5.898 -4.3,-5.9 -4.401,-5.902 -4.59,-5.828 -4.737,-5.687 -4.818,-5.501 -4.82,-5.4
Top Solder:
  region: -4.92,-1.52 -4.92,-0.32 -4.916,-0.205 -4.819,0.004 -4.651,0.16 -4.435,0.239 -4.32,0.235 -4.205,0.239 -3.989,0.16 -3.821,0.004 -3.725,-0.205 -3.72,-0.32 -3.72,-1.52 -3.726,-1.634 -3.823,-1.84 -3.992,-1.993 -4.206,-2.07 -4.32,-2.065 -4.434,-2.07 -4.649,-1.993 -4.817,-1.84 -4.915,-1.634 -4.92,-1.52
  region: 3.72,-1.52 3.72,-0.32 3.725,-0.205 3.821,0.004 3.989,0.16 4.205,0.239 4.32,0.235 4.435,0.239 4.651,0.16 4.819,0.004 4.916,-0.205 4.92,-0.32 4.92,-1.52 4.915,-1.634 4.817,-1.84 4.649,-1.993 4.434,-2.07 4.32,-2.065 4.206,-2.07 3.992,-1.993 3.823,-1.84 3.726,-1.634 3.72,-1.52
  region: 3.72,-5.4 3.72,-4.8 3.72,-4.68 3.81,-4.458 3.979,-4.288 4.2,-4.196 4.32,-4.195 4.44,-4.196 4.661,-4.288 4.83,-4.458 4.92,-4.68 4.92,-4.8 4.92,-5.4 4.919,-5.519 4.828,-5.738 4.659,-5.905 4.439,-5.995 4.32,-5.995 4.201,-5.995 3.981,-5.905 3.812,-5.738 3.721,-5.519 3.72,-5.4
  region: -4.92,-5.4 -4.92,-4.8 -4.92,-4.68 -4.83,-4.458 -4.661,-4.288 -4.44,-4.196 -4.32,-4.195 -4.2,-4.196 -3.979,-4.288 -3.81,-4.458 -3.72,-4.68 -3.72,-4.8 -3.72,-5.4 -3.721,-5.519 -3.812,-5.738 -3.981,-5.905 -4.201,-5.995 -4.32,-5.995 -4.439,-5.995 -4.659,-5.905 -4.828,-5.738 -4.919,-5.519 -4.92,-5.4
Milling:
  lines w0.6: -4.318,-5.4 -4.318,-4.78 ; -4.318,-1.465 -4.318,-0.365 ; 4.318,-5.4 4.318,-4.78 ; 4.318,-1.465 4.318,-0.365
tDocu:
  region: 3.025,-0.595 3.025,-0.095 3.425,-0.095 3.425,-0.595
  region: 2.25,-0.595 2.25,-0.095 2.65,-0.095 2.65,-0.595
  region: 1.65,-0.6 1.65,-0.1 1.85,-0.1 1.85,-0.6
  region: 1.15,-0.6 1.15,-0.1 1.35,-0.1 1.35,-0.6
  region: 0.65,-0.595 0.65,-0.095 0.85,-0.095 0.85,-0.595
  region: 0.15,-0.595 0.15,-0.095 0.35,-0.095 0.35,-0.595
  region: -0.35,-0.595 -0.35,-0.095 -0.15,-0.095 -0.15,-0.595
  region: -0.85,-0.595 -0.85,-0.095 -0.65,-0.095 -0.65,-0.595
  region: -1.35,-0.595 -1.35,-0.095 -1.15,-0.095 -1.15,-0.595
  region: -1.85,-0.595 -1.85,-0.095 -1.65,-0.095 -1.65,-0.595
  region: -2.65,-0.595 -2.65,-0.095 -2.25,-0.095 -2.25,-0.595
  region: -3.425,-0.595 -3.425,-0.095 -3.025,-0.095 -3.025,-0.595
  lines w0.01: -4.32,-5.895 -4.32,-4.295 ; -4.32,-1.965 -4.32,-0.345 ; 4.32,-5.895 4.32,-4.295 ; 4.32,-1.965 4.32,-0.345
  lines w0.152: -4.32,-7.7 cw(c0,-30.692) 4.32,-7.7 ; -4.32,-7.695 4.32,-7.695 4.32,-0.345 -4.32,-0.345 -4.32,-7.695
tPlace:
  lines w0.203: -4.32,-4 -4.32,-2.2 ; 4.32,-4 4.32,-2.2

## USB-MICROB [mm]
pads (9):
  rect 1.4x0.35 smd: D+(-2.65,0) D-(-2.65,-0.65) GND(-2.65,1.3) ID(-2.65,0.65) VBUS(-2.65,-1.3)
  rect 1.9x1.8 smd: MT1(0,-4) MT2(0,4)
  rect 1.9x1.9 smd: P$1(0,-1.27) P$2(0,1.27)
tDocu:
  lines w0.127: 1.45,-3.4 2.15,-3.4 2.15,-3 2.55,-3 ccw(c2.565,-2.762) 2.8,-2.8 2.8,2.75 ccw(c2.563,2.765) 2.6,3 2.15,3 2.15,3.4 1.45,3.4 ; 1.45,-3.4 -2.85,-3.4 -2.85,-2.2 -1.45,-2.2 -1.45,2.2 -2.85,2.2 -2.85,3.4 1.45,3.4 ; 1.45,-3.4 1.45,3.4
  lines w0.203: 2.15,-3.4 2.75,-4 ; 2.15,3.4 2.75,4
tPlace:
  lines w0.203: -1.25,-3.4 -2.85,-3.4 -2.85,-2.2 -1.45,-2.2 -1.45,2.2 -2.85,2.2 -2.85,3.4 -1.25,3.4 ; 1.45,-3.4 1.45,3.4